# Altium footprint library Lib_001.PcbLib: 429 footprints (part 22 of 28)
Each footprint in its own frame and in the unit in brackets; x right, y up, seen from the top. Pads: shape width x height; smd on the part's side, far side on the other; paste and mask are expansions set on the pad; w line width, h text height; cw(c..) or ccw(c..) is an arc to the next point about the centre after c.
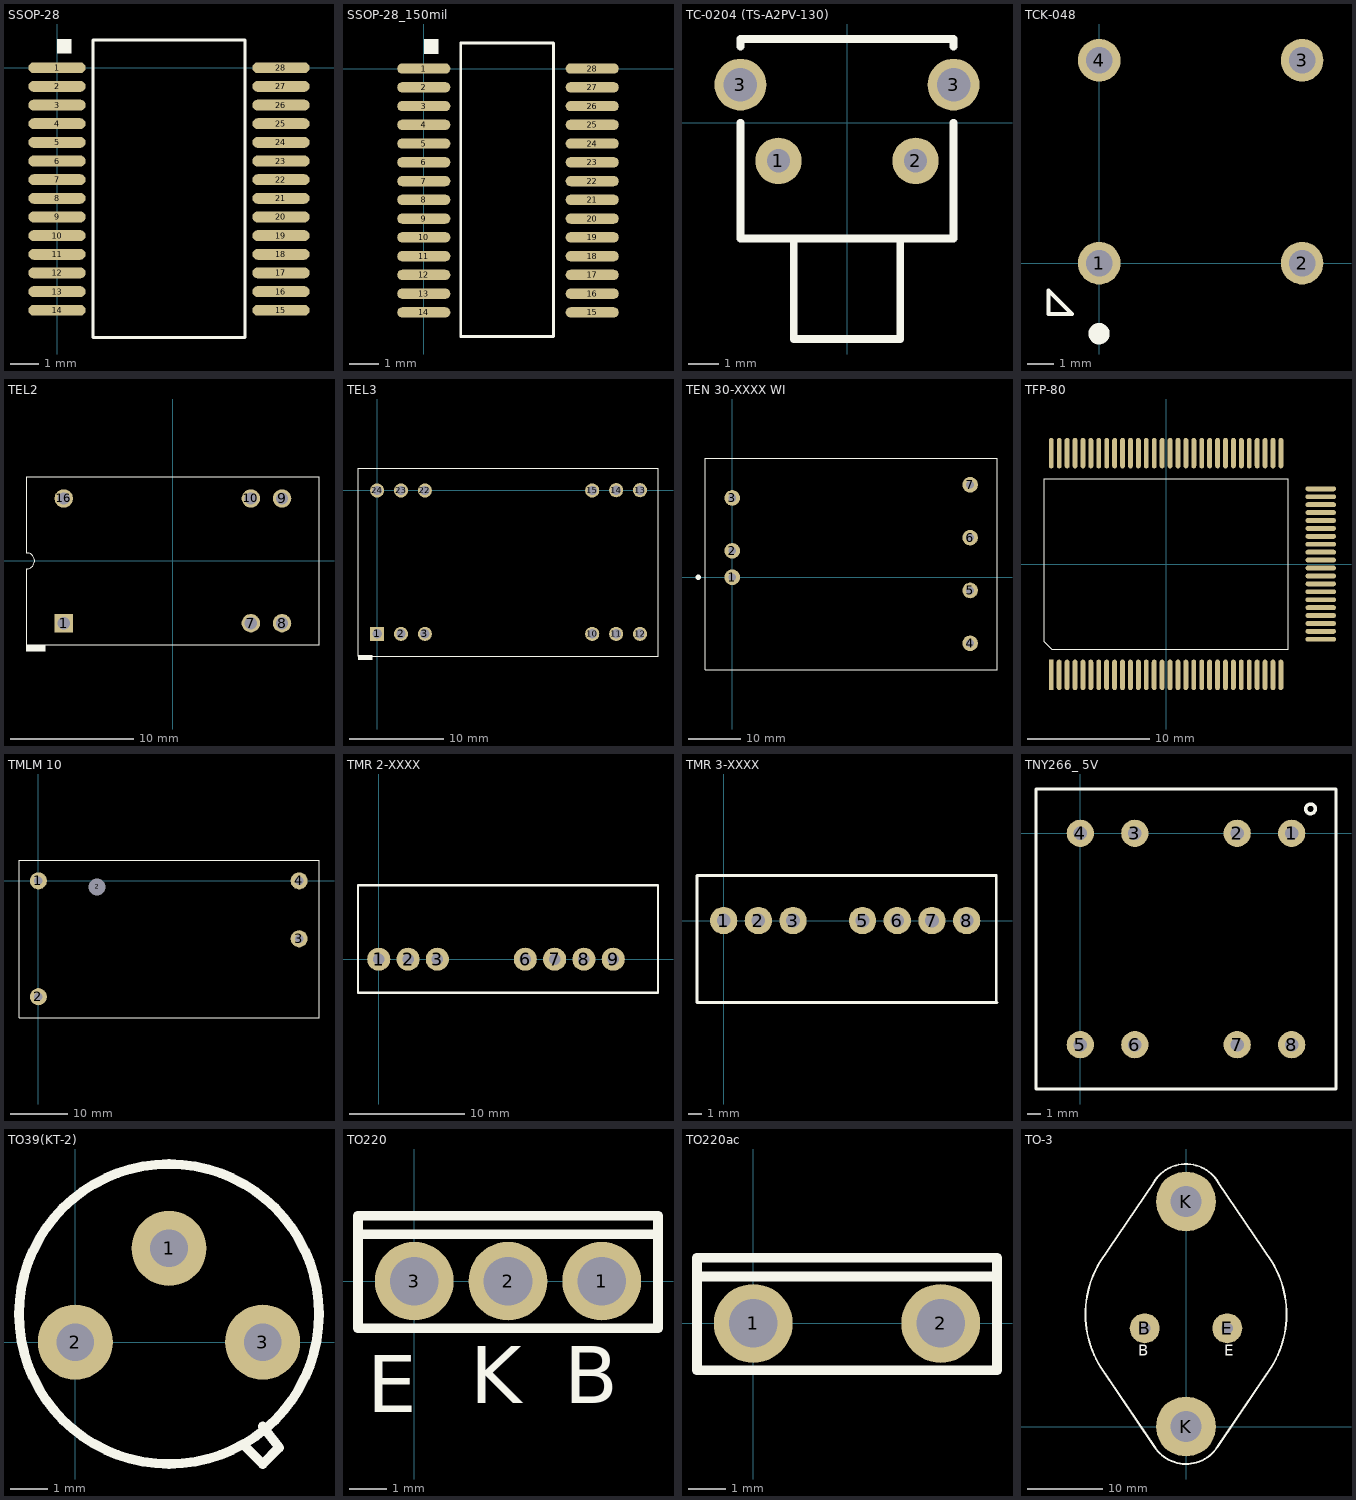
[diagram p21: the footprints below, top view; thin cyan lines are the x and y axes]

## SSOP-28 [mm]
height 2
pads (28):
  oval 2x0.38 smd: 1(0,0) 2(0,-0.65) 3(0,-1.3) 4(0,-1.95) 5(0,-2.6) 6(0,-3.25) 7(0,-3.9) 8(0,-4.55) 9(0,-5.2) 10(0,-5.85) 11(0,-6.5) 12(0,-7.15) 13(0,-7.8) 14(0,-8.45) 15(7.8,-8.45) 16(7.8,-7.8) 17(7.8,-7.15) 18(7.8,-6.5) 19(7.8,-5.85) 20(7.8,-5.2) 21(7.8,-4.55) 22(7.8,-3.9) 23(7.8,-3.25) 24(7.8,-2.6) 25(7.8,-1.95) 26(7.8,-1.3) 27(7.8,-0.65) 28(7.8,0)
Top Overlay:
  rectangle: 0,0.5 0.5,1
  lines w0.1: 1.25,-9.4 6.55,-9.4 6.55,0.97 1.25,0.97 1.25,-9.4
3D body "User Library-SSOP-28-1.step": height 2.15, standoff 0, extent -0.008,-9.385 7.748,0.945

## SSOP-28_150mil [mm]
height 2
pads (28):
  oval 1.8x0.35 smd: 1(0,0) 2(0,-0.635) 3(0,-1.27) 4(0,-1.905) 5(0,-2.54) 6(0,-3.175) 7(0,-3.81) 8(0,-4.445) 9(0,-5.08) 10(0,-5.715) 11(0,-6.35) 12(0,-6.985) 13(0,-7.62) 14(0,-8.255) 15(5.7,-8.255) 16(5.7,-7.62) 17(5.7,-6.985) 18(5.7,-6.35) 19(5.7,-5.715) 20(5.7,-5.08) 21(5.7,-4.445) 22(5.7,-3.81) 23(5.7,-3.175) 24(5.7,-2.54) 25(5.7,-1.905) 26(5.7,-1.27) 27(5.7,-0.635) 28(5.7,0)
Top Overlay:
  rectangle: 0,0.5 0.5,1
  lines w0.1: 1.25,-9.07 1.25,0.86 4.39,0.86 4.39,-9.07 1.25,-9.07
3D body "User Library-ssop_28_39_asm.STEP": height 1.67, standoff -0.01, extent -0.16,-9.09 5.84,0.81

## TC-0204 (TS-A2PV-130) [mm] "Кнопка тактовая угловая h=6мм"
pads (4):
  round 1.524 hole 0.762: 1(-2.25,-1.25) 2(2.25,-1.25)
  round 1.7 hole 1.1: 3(-3.5,1.25) 3(3.5,1.25)
Top Overlay:
  lines w0.254: -3.5,0 -3.5,-3.8 3.5,-3.8 3.5,0 ; -3.5,2.5 -3.5,2.75 3.5,2.75 3.5,2.5 ; -1.75,-3.85 -1.75,-7.1 1.75,-7.1 1.75,-3.85
3D body "43396.stp": height 7.4, standoff -3.5, extent -4.26,-9.58 4.24,2.82

## TCK-048 [mm] "CommonModeChoke"
pads (4):
  round 1.6 hole 1: 1(0,0) 2(7.62,0) 3(7.62,7.62) 4(0,7.62)
Top Overlay:
  circle w0.4: c-0.005,-2.649 r0.2
  lines w0.15: -1.901,-1.91 -1.901,-1.028 -1.019,-1.91 -1.901,-1.91
3D body "TCK-048.stp": height 6.96, standoff -2.5, extent -1.901,-1.91 9.521,9.529

## TEL2 [mm]
height 5.08
pads (6):
  rect 1.5x1.5 hole 1: 1(-8.89,-5.08)
  round 1.5 hole 1: 7(6.35,-5.08) 8(8.89,-5.08) 9(8.89,5.08) 10(6.35,5.08) 16(-8.89,5.08)
Top Overlay:
  region: -11.938,-6.858 -11.938,-7.366 -10.414,-7.366 -10.414,-6.858
  lines w0.1: -11.9,-6.85 11.9,-6.85 11.9,6.85 -11.9,6.85 -11.9,0.635 cw(c-11.9,0) -11.9,-0.635 -11.9,-6.85
3D body "User Library-TRACO TEL2.step": height 7.62, standoff -3.2, extent -11.892,-6.85 11.907,6.85

## TEL3 [mm]
pads (12):
  rect 1.5x1.5 hole 1: 1(0,-15.24)
  round 1.5 hole 1: 2(2.54,-15.24) 3(5.08,-15.24) 10(22.86,-15.24) 11(25.4,-15.24) 12(27.94,-15.24) 13(27.94,0.03) 14(25.4,0.03) 15(22.86,0) 22(5.08,0) 23(2.54,0) 24(0,0)
Top Overlay:
  region: -2.024,-17.496 -2.024,-18.004 -0.5,-18.004 -0.5,-17.496
  lines w0.1: -2.03,-17.62 29.85,-17.62 29.85,2.38 -2.03,2.38 -2.03,-17.62
3D body "tel3.stp": height 11, standoff -3.75, extent -1.6,-17.85 30.1,2.35

## TEN 30-XXXX WI [mm] "Traco Power"
pads (7):
  round 3 hole 1.5: 1(0,0) 2(0,5.08) 3(0,15.24) 4(45.72,-12.7) 5(45.72,-2.54) 6(45.72,7.62) 7(45.72,17.78)
Top Overlay:
  circle w0.5: c-6.52,0 r0.25
  lines w0.2: -5.197,-17.75 -5.197,22.85 50.897,22.85 50.897,-17.75 -5.197,-17.75
3D body "TEN30WIHS.step": height 16.5, standoff -5.6, extent -5.197,-17.75 50.897,22.85

## TFP-80 [mm]
pads (80):
  rect 0.4x2.5 smd: 1(-9.423,-9.1)
  oval 0.4x2.5 smd: 2(-8.773,-9.1) 3(-8.123,-9.1) 4(-7.473,-9.1) 5(-6.823,-9.1) 6(-6.173,-9.1) 7(-5.523,-9.1) 8(-4.873,-9.1) 9(-4.223,-9.1) 10(-3.573,-9.1) 11(-2.923,-9.1) 12(-2.273,-9.1) 13(-1.623,-9.1) 14(-0.973,-9.1) 15(-0.323,-9.1) 16(0.327,-9.1) 17(0.977,-9.1) 18(1.627,-9.1) 19(2.277,-9.1) 20(2.927,-9.1) 21(3.577,-9.1) 22(4.227,-9.1) 23(4.877,-9.1) 24(5.527,-9.1) 25(6.177,-9.1) 26(6.827,-9.1) 27(7.477,-9.1) 28(8.127,-9.1) 29(8.777,-9.1) 30(9.427,-9.1) 51(9.43,9.1) 52(8.78,9.1) 53(8.13,9.1) 54(7.48,9.1) 55(6.83,9.1) 56(6.18,9.1) 57(5.53,9.1) 58(4.88,9.1) 59(4.23,9.1) 60(3.58,9.1) 61(2.93,9.1) 62(2.28,9.1) 63(1.63,9.1) 64(0.98,9.1) 65(0.33,9.1) 66(-0.32,9.1) 67(-0.97,9.1) 68(-1.62,9.1) 69(-2.27,9.1) 70(-2.92,9.1) 71(-3.57,9.1) 72(-4.22,9.1) 73(-4.87,9.1) 74(-5.52,9.1) 75(-6.17,9.1) 76(-6.82,9.1) 77(-7.47,9.1) 78(-8.12,9.1) 79(-8.77,9.1) 80(-9.42,9.1)
  oval 2.5x0.4 smd: 31(12.7,-6.18) 32(12.7,-5.53) 33(12.7,-4.88) 34(12.7,-4.23) 35(12.7,-3.58) 36(12.7,-2.93) 37(12.7,-2.28) 38(12.7,-1.63) 39(12.7,-0.983) 40(12.7,-0.333) 41(12.7,0.32) 42(12.7,0.97) 43(12.7,1.62) 44(12.7,2.27) 45(12.7,2.92) 46(12.7,3.57) 47(12.7,4.22) 48(12.7,4.87) 49(12.7,5.52) 50(12.7,6.17)
Top Overlay:
  lines w0.1: -10,-6.383 -9.373,-7.01 10.021,-7.01 10.021,7.014 -10,7.014 -10,-6.383
3D body: height 3.1, standoff 0, extent -10,-7.01 10.021,7.014

## TMLM 10 [mm] "AC/DC 10W"
pads (5):
  round 3 hole 1.5: 1(0,0) 2(0,-20.32) 3(45.72,-10.16) 4(45.72,0)
  round 1.524 hole 3: 2(10.31,-1.06)
Top Overlay:
  lines w0.1: -3.4,-24 49.2,-24 49.2,3.6 -3.4,3.6 -3.4,-24
3D body "55623.stp": height 23.5, standoff -8, extent -3.4,-24 49.2,3.6

## TMR 2-XXXX [mm]
pads (7):
  round 2 hole 1: 1(0,0) 2(2.54,0) 3(5.08,0) 6(12.7,0) 7(15.24,0) 8(17.78,0) 9(20.32,0)
Top Overlay:
  lines w0.2: -1.8,-2.9 -1.8,6.4 24.2,6.4 24.2,-2.9 -1.8,-2.9
3D body: height 12, standoff 0, extent -1.8,-2.9 24.2,6.4

## TMR 3-XXXX [mm]
pads (7):
  round 2 hole 1: 1(0,0) 2(2.54,0) 3(5.08,0) 5(10.16,0) 6(12.7,0) 7(15.24,0) 8(17.78,0)
Top Overlay:
  lines w0.2: -1.95,-6 -1.95,3.3 19.95,3.3 19.95,-5.95 20,-6 -1.95,-6
3D body "tmr3.stp": height 11.2, standoff -4.1, extent -1.899,-5.848 19.899,3.25

## TNY266_ 5V [mm] "Трансформатор"
pads (8):
  round 2 hole 1: 1(15.5,0) 2(11.5,0) 3(4,0) 4(0,0) 5(0,-15.5) 6(4,-15.5) 7(11.5,-15.5) 8(15.5,-15.5)
Top Overlay:
  circle w0.254: c16.88,1.79 r0.354
  lines w0.254: -3.25,-18.75 -3.25,0 -3.25,3.24 ; -3.25,3.25 0,3.25 18.75,3.25 18.75,-15.5 18.75,-18.74 ; -3.24,-18.75 0,-18.75 18.75,-18.75
3D body: height 0, standoff -1, extent 15.054,-15.949 15.95,-15.051
3D body: height 0, standoff -1, extent 11.054,-15.949 11.95,-15.051
3D body: height 0, standoff -1, extent 3.554,-15.949 4.45,-15.051
3D body: height 0, standoff -1, extent -0.446,-15.949 0.45,-15.051
3D body: height 0, standoff -1, extent 15.054,-0.449 15.95,0.449
3D body: height 0, standoff -1, extent 11.054,-0.449 11.95,0.449
3D body: height 0, standoff -1, extent 3.554,-0.449 4.45,0.449
3D body: height 0, standoff -1, extent -0.446,-0.449 0.45,0.449
3D body: height 15, standoff 0.02, extent -3.25,-18.74 18.75,3.25

## TO39(KT-2) [mm]
pads (3):
  round 2 hole 1: 1(2.5,2.5) 2(0,0) 3(5,0)
Top Overlay:
  circle w0.254: c2.5,0.75 r4
  lines w0.254: 4.5,-2.75 5,-3.25 5.437,-2.813 5,-2.25
3D body "User Library-TO-39_KT-2-7.STEP": height 9.05, standoff -0.6, extent -2.099,-4.35 7.1,4.85

## TO220 [mm]
pads (3):
  round 2.1 hole 1.3: 1(5,0) 2(2.5,0) 3(0,0)
Top Overlay:
  lines w0.254: -1.5,1.25 -1.5,1.75 6.5,1.75 6.5,1.25 ; -1.5,1.25 6.5,1.25 ; -1.5,1.25 -1.5,-0.375 -1.5,-1.25 6.5,-1.25 6.5,1.25
  text "B" at 4,-3.25 h1.52
  text "K" at 1.5,-3.25 h1.52
  text "E" at -1.25,-3.5 h1.52
3D body "SW3DPS-TO-220HS-DEFAULT.STEP": height 18.54, standoff -3.81, extent -2.54,-1.397 7.62,3.175

## TO220ac [mm]
pads (2):
  round 2.1 hole 1.3: 1(0,0) 2(5,0)
Top Overlay:
  lines w0.254: -1.5,1.25 -1.5,1.75 6.5,1.75 6.5,1.25 ; -1.5,1.25 6.5,1.25 ; -1.5,1.25 -1.5,-0.375 -1.5,-1.25 6.5,-1.25 6.5,1.25
3D body "User Library-TO 220-2.STEP": height 19.3, standoff -9.08, extent -2.326,-2 7.326,2.5

## TO-3 [mm]
pads (4):
  round 4 hole 1.5: B(-5.5,13.1) E(5.5,13.1)
  round 8 hole 4.1: K(0,0) K(0,30)
Top Overlay:
  lines w0.254: 4.198,-2.716 11.378,7.906 ccw(c0.01,14.999) 11.503,21.888 4.322,32.514 ccw(c0,30) -4.322,32.514 -11.503,21.888 ccw(c-0.01,14.999) -11.378,7.906 -4.198,-2.716 ccw(c0,0) 4.322,-2.514
  text "B" at -6.35,8.89 h2.5
  text "E" at 5.08,8.89 h2.5
Bottom Overlay:
  text "E" at 5.08,8.89 h2.5
  text "B" at -6.35,8.89 h2.5
3D body "User Library-TO-3_Long.STEP": height 8.5, standoff -12, extent -13.089,-4.87 13.089,34.72